# Altium footprint library 封装库.PcbLib: 755 footprints (part 36 of 48)
Each footprint in its own frame and in the unit in brackets; x right, y up, seen from the top. Pads: shape width x height; smd on the part's side, far side on the other; paste and mask are expansions set on the pad; w line width, h text height; cw(c..) or ccw(c..) is an arc to the next point about the centre after c.
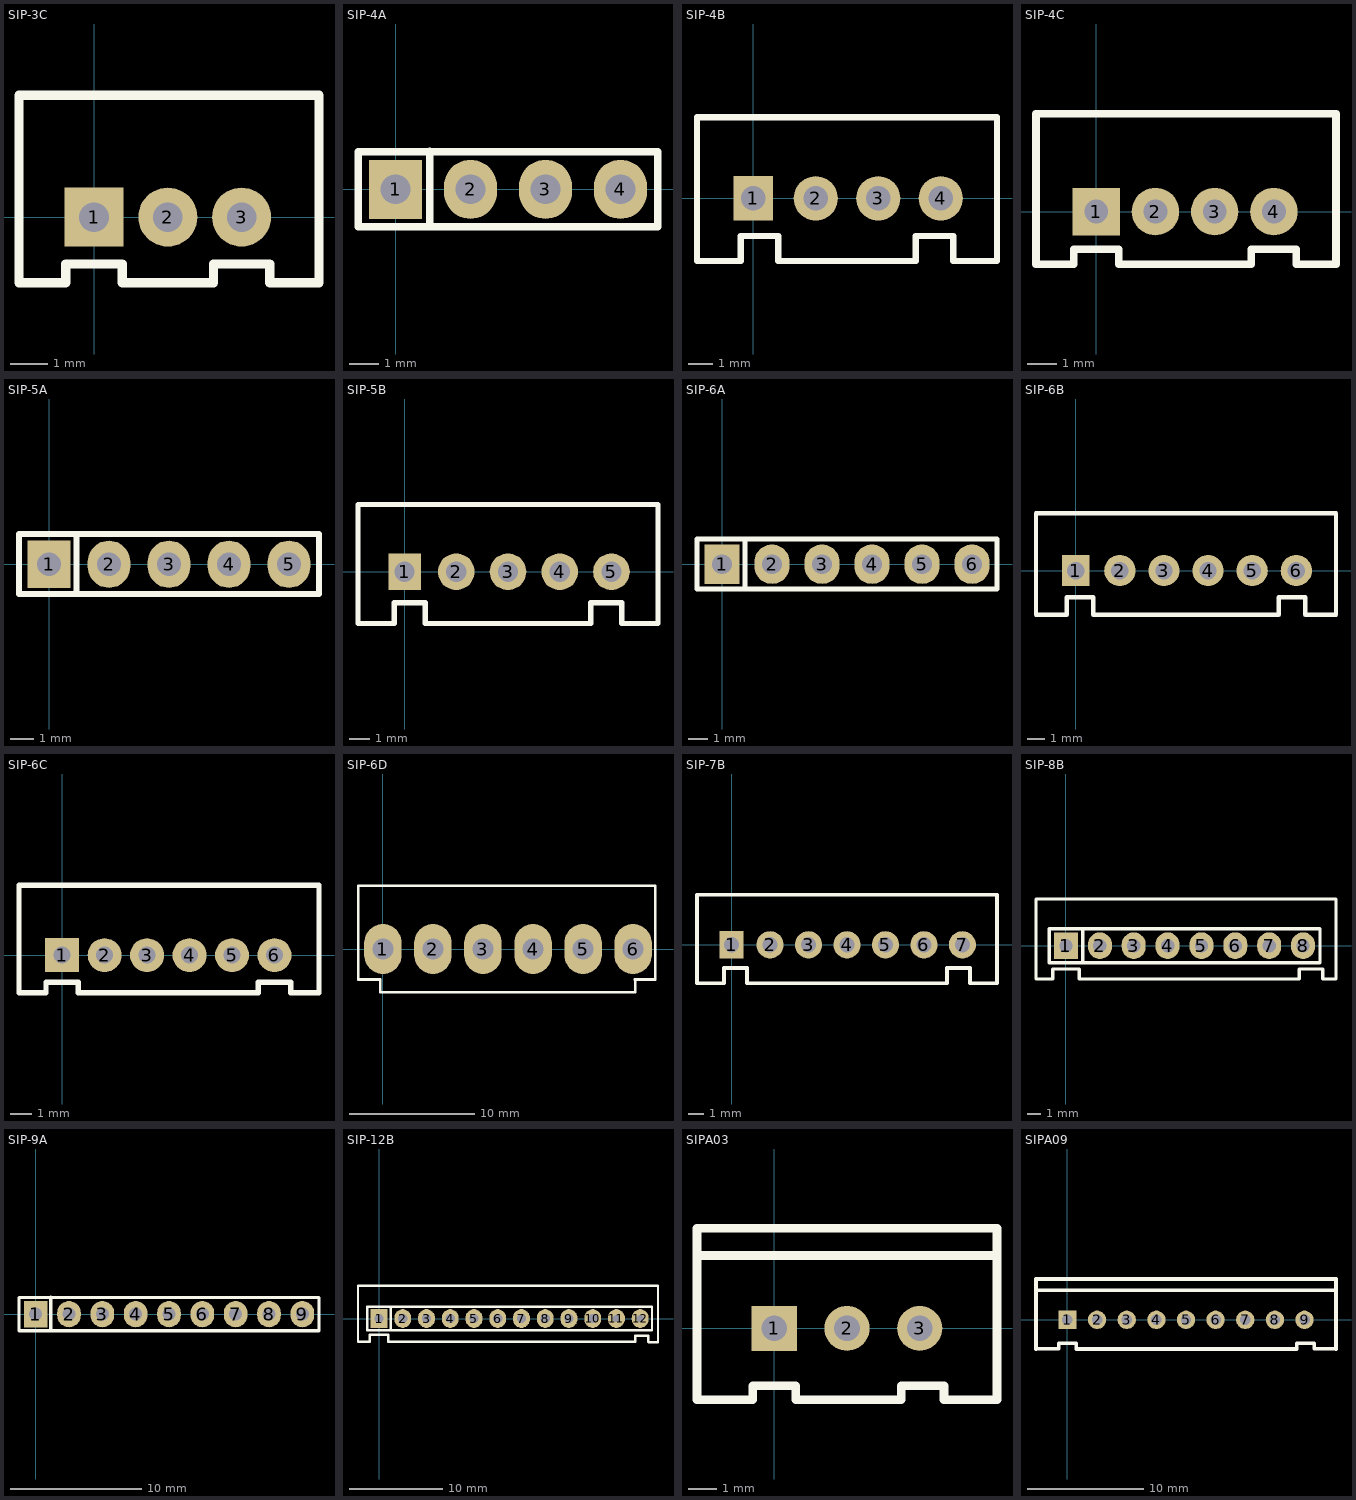
[diagram p35: the footprints below, top view; thin cyan lines are the x and y axes]

## SIP-3C [mm]
pads (3):
  rect 1.6x1.6 hole 0.8: 1(0,0)
  round 1.6 hole 0.8: 2(2,0) 3(4,0)
Top Overlay:
  lines w0.254: -2.032,-1.778 -0.762,-1.778 -0.762,-1.27 0.762,-1.27 0.762,-1.778 3.238,-1.778 3.238,-1.27 4.762,-1.27 4.762,-1.778 6.096,-1.778 6.096,3.302 -2.032,3.302 -2.032,-1.778

## SIP-4A [mm]
pads (4):
  rect 1.8x2 hole 1: 1(0,0)
  oval 1.8x2 hole 1: 2(2.54,0) 3(5.08,0) 4(7.62,0)
Top Overlay:
  lines w0.254: 1.16,-1.25 1.16,1.29 ; -1.27,-1.27 -1.27,1.27 8.89,1.27 8.89,-1.27 -1.27,-1.27

## SIP-4B [mm]
pads (4):
  rect 1.6x1.8 hole 1: 1(0,0)
  round 1.8 hole 1: 2(2.54,0) 3(5.08,0) 4(7.62,0)
Top Overlay:
  lines w0.254: -2.286,-2.54 -0.508,-2.54 -0.508,-1.524 1.016,-1.524 1.016,-2.54 6.604,-2.54 6.604,-1.524 8.128,-1.524 8.128,-2.54 9.906,-2.54 9.906,3.302 -2.286,3.302 -2.286,-2.54

## SIP-4C [mm]
pads (4):
  rect 1.6x1.6 hole 0.8: 1(0,0)
  round 1.6 hole 0.8: 2(2,0) 3(4,0) 4(6,0)
Top Overlay:
  lines w0.254: -2.032,-1.778 -0.762,-1.778 -0.762,-1.27 0.762,-1.27 0.762,-1.778 5.238,-1.778 5.238,-1.27 6.762,-1.27 6.762,-1.778 8.096,-1.778 8.096,3.302 -2.032,3.302 -2.032,-1.778

## SIP-5A [mm]
pads (5):
  rect 1.8x2 hole 1: 1(0,0)
  oval 1.8x2 hole 1: 2(2.54,0) 3(5.08,0) 4(7.62,0) 5(10.16,0)
Top Overlay:
  lines w0.254: 1.16,-1.25 1.16,1.29 ; -1.27,-1.27 11.43,-1.27 11.43,1.27 -1.27,1.27 -1.27,-1.27

## SIP-5B [mm]
pads (5):
  rect 1.6x1.8 hole 1: 1(0,0)
  round 1.8 hole 1: 2(2.54,0) 3(5.08,0) 4(7.62,0) 5(10.16,0)
Top Overlay:
  lines w0.254: -2.286,-2.54 -0.508,-2.54 -0.508,-1.524 1.016,-1.524 1.016,-2.54 9.144,-2.54 9.144,-1.524 10.668,-1.524 10.668,-2.54 12.446,-2.54 12.446,3.302 -2.286,3.302 -2.286,-2.54

## SIP-6A [mm]
pads (6):
  rect 1.8x2 hole 1: 1(0,0)
  oval 1.8x2 hole 1: 2(2.54,0) 3(5.08,0) 4(7.62,0) 5(10.16,0) 6(12.7,0)
Top Overlay:
  lines w0.254: 1.16,-1.25 1.16,1.29 ; -1.27,-1.27 -1.27,1.27 13.97,1.27 13.97,-1.27 -1.27,-1.27

## SIP-6B [mm]
pads (6):
  rect 1.6x1.8 hole 1: 1(0,0)
  round 1.8 hole 1: 2(2.54,0) 3(5.08,0) 4(7.62,0) 5(10.16,0) 6(12.7,0)
Top Overlay:
  lines w0.254: -2.286,-2.54 -0.508,-2.54 -0.508,-1.524 1.016,-1.524 1.016,-2.54 11.684,-2.54 11.684,-1.524 13.208,-1.524 13.208,-2.54 14.986,-2.54 14.986,3.302 -2.286,3.302 -2.286,-2.54

## SIP-6C [mm]
pads (6):
  rect 1.6x1.6 hole 0.8: 1(0,0)
  round 1.6 hole 0.8: 2(2,0) 3(4,0) 4(6,0) 5(8,0) 6(10,0)
Top Overlay:
  lines w0.254: 9.22,-1.778 0.762,-1.778 0.762,-1.27 -0.762,-1.27 -0.762,-1.778 -2.032,-1.778 -2.032,3.302 12.09,3.302 ; 9.238,-1.778 9.238,-1.27 10.762,-1.27 10.762,-1.778 12.096,-1.778 12.096,3.302

## SIP-6D [mil]
pads (6):
  oval 118x157 hole 67: 1(0,0) 2(157.48,0) 3(314.96,0) 4(472.44,0) 5(629.92,0) 6(787.4,0)
Top Overlay:
  lines w8: -78,199 -78,-96 -9,-96 -9,-136 794,-136 794,-96 ; -76,199 857,199 857,-96 793,-96

## SIP-7B [mm]
pads (7):
  rect 1.6x1.8 hole 1: 1(0,0)
  round 1.8 hole 1: 2(2.54,0) 3(5.08,0) 4(7.62,0) 5(10.16,0) 6(12.7,0) 7(15.24,0)
Top Overlay:
  lines w0.254: -2.286,-2.54 -0.508,-2.54 -0.508,-1.524 1.016,-1.524 1.016,-2.54 14.224,-2.54 14.224,-1.524 15.748,-1.524 15.748,-2.54 17.526,-2.54 17.526,3.302 -2.286,3.302 -2.286,-2.54

## SIP-8B [mm]
pads (8):
  rect 1.8x2 hole 1: 1(0,0)
  oval 1.8x2 hole 1: 2(2.54,0) 3(5.08,0) 4(7.62,0) 5(10.16,0) 6(12.7,0) 7(15.24,0) 8(17.78,0)
Top Overlay:
  lines w0.254: 1.27,-1.27 1.27,1.27 ; -2.25,-2.5 -2.25,3.5 20.25,3.5 20.25,-2.5 19.25,-2.5 19.25,-1.75 19,-1.75 17.5,-1.75 17.5,-2.5 1,-2.5 1,-1.75 -1,-1.75 -1,-2.5 -2.25,-2.5 ; -1.27,-1.27 19.05,-1.27 19.05,1.27 -1.27,1.27 -1.27,-1.27

## SIP-9A [mm]
pads (9):
  rect 1.8x2 hole 1: 1(0,0)
  oval 1.8x2 hole 1: 2(2.54,0) 3(5.08,0) 4(7.62,0) 5(10.16,0) 6(12.7,0) 7(15.24,0) 8(17.78,0) 9(20.32,0)
Top Overlay:
  lines w0.254: 1.16,-1.25 1.16,1.29 ; -1.27,-1.27 -1.27,1.27 21.59,1.27 21.59,-1.27 -1.27,-1.27

## SIP-12B [mm]
pads (12):
  rect 1.8x2 hole 1: 1(0,0)
  oval 1.8x2 hole 1: 2(2.54,0) 3(5.08,0) 4(7.62,0) 5(10.16,0) 6(12.7,0) 7(15.24,0) 8(17.78,0) 9(20.32,0) 10(22.86,0)
  oval 1.8x2 hole 0.8: 11(25.4,0) 12(27.94,0)
Top Overlay:
  lines w0.254: 1.27,-1.27 1.27,1.27 ; 10.45,-2.5 11.7,-2.5 ; 18.263,-1.27 29.21,-1.27 29.21,1.245 ; 18.5,-1.27 24.028,-1.27 ; 19.05,-1.27 -1.27,-1.27 -1.27,1.27 ; 19.05,1.27 -1.27,1.27 ; 20.065,3.5 25.065,3.5 ; 20.25,3.5 -2.25,3.5 -2.25,-2.5 -1,-2.5 -1,-1.75 1,-1.75 1,-2.5 17.5,-2.5 21.986,-2.5 27.407,-2.5 27.407,-1.854 28.804,-1.854 28.804,-2.475 ; 22.784,3.5 29.85,3.5 29.85,-2.342 29.85,-2.535 28.864,-2.535 ; 23.47,1.27 29.185,1.27 ; 24.028,1.27 -1.27,1.27

## SIPA03 [mil]
pads (3):
  rect 62x62 hole 35.43: 1(0,0)
  round 62 hole 35.43: 2(100,0) 3(200,0)
Top Overlay:
  lines w11.81: -106.3,-98.42 -29.53,-98.42 -29.53,-78.74 29.53,-78.74 29.53,-98.42 ; 174.41,-98.42 174.41,-78.74 233.47,-78.74 233.47,-98.42 306.3,-98.42
  lines w12: -106.3,-98.42 -106.3,137.79 304.72,137.79 ; -106.3,100 304.72,100 ; 29.53,-98.42 174.41,-98.42 ; 306.3,-98.42 306.3,137.79

## SIPA09 [mil]
pads (9):
  rect 62x62 hole 35.43: 1(0,0)
  round 62 hole 35.43: 2(100,0) 3(200,0) 4(300,0) 5(400,0) 6(500,0) 7(600,0) 8(700,0) 9(800,0)
Top Overlay:
  lines w11.81: -106.3,-98.42 -29.53,-98.42 -29.53,-78.74 29.53,-78.74 29.53,-98.42 ; 774.41,-98.42 774.41,-78.74 833.47,-78.74 833.47,-98.42 906.3,-98.42
  lines w12: -106.3,-98.42 -106.3,137.79 904.72,137.79 ; -106.3,100 904.72,100 ; 29.53,-98.42 774.41,-98.42 ; 906.3,-98.42 906.3,137.79